# Altium footprint library UltraZOhm_CarrierBoard.PcbLib: 71 footprints (part 5 of 5)
Each footprint in its own frame and in the unit in brackets; x right, y up, seen from the top. Pads: shape width x height; smd on the part's side, far side on the other; paste and mask are expansions set on the pad; w line width, h text height; cw(c..) or ccw(c..) is an arc to the next point about the centre after c.
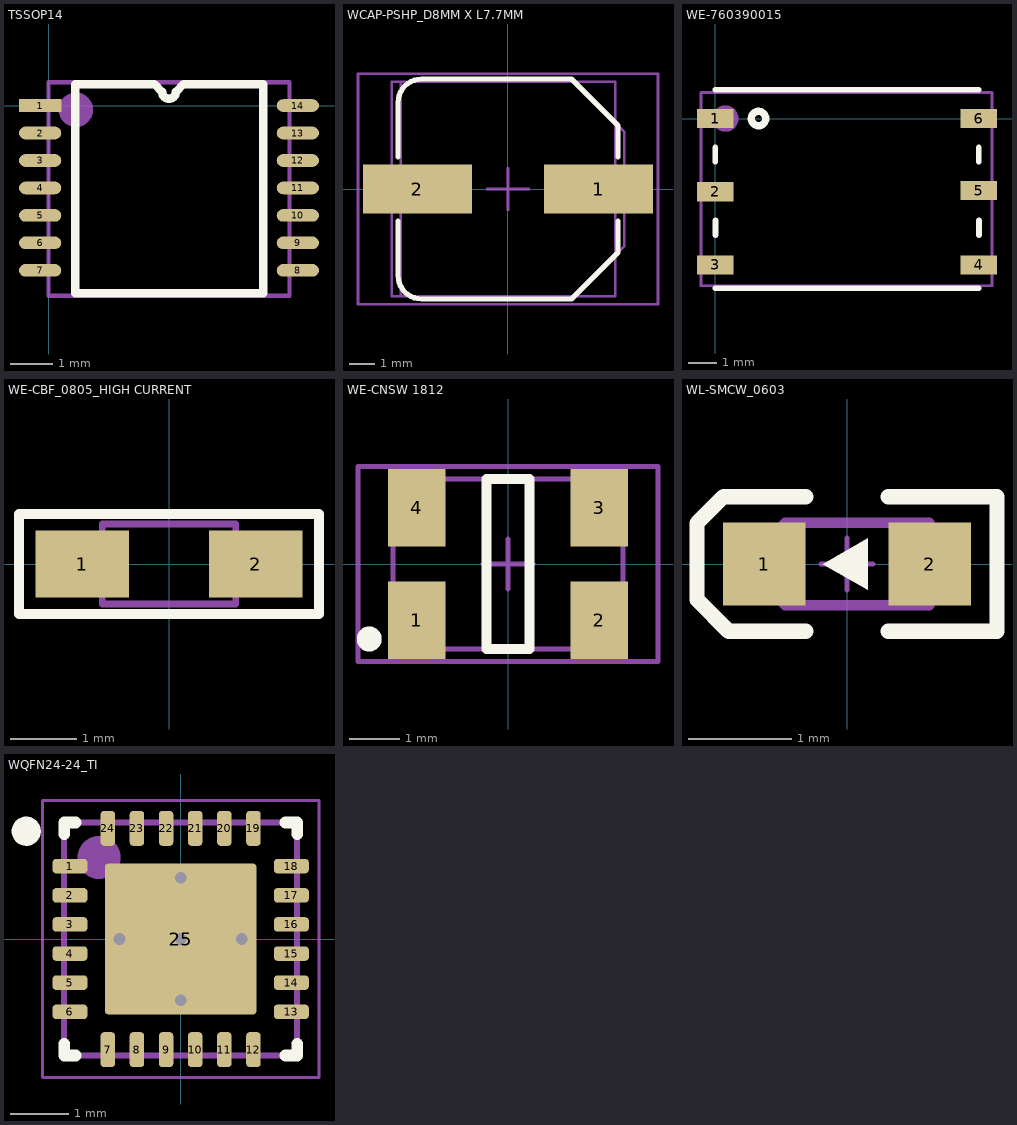
[diagram p4: the footprints below, top view; thin cyan lines are the x and y axes]

## TSSOP14 [mm]
pads (14):
  rect 1x0.3 smd: 1(-0.2,0)
  oval 1x0.3 smd: 2(-0.2,-0.65) 3(-0.2,-1.3) 4(-0.2,-1.95) 5(-0.2,-2.6) 6(-0.2,-3.25) 7(-0.2,-3.9) 8(5.9,-3.9) 9(5.9,-3.25) 10(5.9,-2.6) 11(5.9,-1.95) 12(5.9,-1.3) 13(5.9,-0.65) 14(5.9,0)
Top Overlay:
  lines w0.2: 0.635,-4.445 0.635,0.508 2.505,0.508 2.688,0.325 ccw(c2.85,0.325) 3.012,0.325 3.195,0.508 5.08,0.508 5.08,-4.445 0.635,-4.445
Mechanical 5:
  circle w0.406: c0.646,-0.1 r0.203
  lines w0.1: 0,-4.5 5.7,-4.5 5.7,0.55 0,0.55 0,-4.5
  text ".Designator" at 1.653,-2.554 h0.76
3D body: height 1.1, standoff 0.15, extent 0.635,-4.5 5.08,0.6
3D body "User Library-tssop14-2.STEP": height 1.2, standoff 0, extent -0.343,-4.5 6.057,0.6

## WCAP-PSHP_D8MM X L7.7MM [mm]
pads (2):
  rect 4.2x1.9 smd: 1(3.5,0) 2(-3.5,0)
Top Overlay:
  lines w0.2: -4.25,-1.25 -4.25,-3.35 ccw(c-3.35,-3.35) -3.35,-4.25 2.45,-4.25 4.25,-2.45 4.25,-1.25 ; -4.25,1.25 -4.25,3.35 cw(c-3.35,3.35) -3.35,4.25 2.45,4.25 4.25,2.45 4.25,1.25
Mechanical 5:
  lines w0.1: -4.5,-4.15 2.55,-4.15 4.5,-2.2 4.5,2.2 2.55,4.15 -4.5,4.15 -4.5,-4.15
  text ".Designator" at -2.4,-0.8 h1.52
Mechanical 11:
  lines w0.1: -4.15,-4.15 -4.15,4.15 4.15,4.15 4.15,-4.15 -4.15,-4.15
Mechanical 15:
  lines w0.1: -0.8,0 0.8,0 ; 0,-0.8 0,0.8 ; -5.8,-4.45 5.8,-4.45 5.8,4.45 -5.8,4.45 -5.8,-4.45
3D body "8x7.7x3.1.stp": height 7.67, standoff -0.03, extent -4.5,-4.15 4.5,4.15

## WE-760390015 [mm]
pads (6):
  rect 1.27x0.66 smd: 1(0,0) 2(0,-2.54) 3(0,-5.08) 4(9.14,-5.08) 5(9.14,-2.5) 6(9.14,0)
Top Overlay:
  circle w0.254: c1.5,0 r0.25
  lines w0.2: 0,-5.889 9.14,-5.889 ; 0,-1.5 0,-1 ; 0,1 9.14,1 ; 0.008,-4.04 0.008,-3.54 ; 9.14,-1.5 9.14,-1 ; 9.152,-4.04 9.152,-3.54
Mechanical 5:
  circle w0.457: c0.35,0 r0.229
  lines w0.1: -0.5,-5.8 -0.5,0.9 9.6,0.9 9.6,-5.8 -0.5,-5.8
  text ".Designator" at 5.008,-4.535 h1.52
3D body "250-1109 (rev1).STEP": height 4.19, standoff 0, extent -0.464,-5.822 9.586,0.908

## WE-CBF_0805_HIGH CURRENT [mm]
pads (2):
  rect 1.4x1 smd: 1(-1.3,0) 2(1.3,0)
Top Overlay:
  lines w0.15: -2.25,-0.75 -2.25,0.75 2.25,0.75 2.25,-0.75 -2.25,-0.75
Mechanical 5:
  lines w0.1: -1,-0.6 1,-0.6 1,0.6 -1,0.6 -1,-0.6
  text ".Designator" at 0.576,0.39 h0.76
Mechanical 15:
  lines w0.1: -1,-0.6 -1,0.6 1,0.6 1,-0.6 -1,-0.6
3D body "WE-CBF_0805_CBF.stp": height 0.93, standoff 0.03, extent -1,-0.6 1,0.6

## WE-CNSW 1812 [mm]
pads (4):
  rect 1.15x1.55 smd: 1(-1.825,-1.125) 2(1.825,-1.125) 3(1.825,1.125) 4(-1.825,1.125)
Top Overlay:
  circle w0.25: c-2.775,-1.5 r0.125
  lines w0.2: -0.425,-1.7 0.425,-1.7 0.425,1.7 -0.425,1.7 -0.425,-1.7
Mechanical 5:
  lines w0.1: -2.3,-1.7 2.3,-1.7 2.3,1.7 -2.3,1.7 -2.3,-1.7
  lines w0.381: -1.703,-1.243 cw(c-1.829,-1.235) -1.703,-1.222
  text ".Designator" at -1.097,-0.254 h0.76
Mechanical 15:
  lines w0.1: -0.5,0 0.5,0 ; 0,-0.5 0,0.5 ; -3,-1.95 3,-1.95 3,1.95 -3,1.95 -3,-1.95
3D body "WE-CNSW_1812_CNSW.stp": height 2.8, standoff -0.05, extent -2.25,-1.6 2.25,1.6

## WL-SMCW_0603 [mm]
pads (2):
  rect 0.8x0.8 smd: 1(-0.8,0) 2(0.8,0)
Top Overlay:
  region: -0.233,0 0.2,-0.25 0.2,0.25
  lines w0.15: -0.4,-0.654 -1.146,-0.654 -1.454,-0.346 -1.454,0.396 -1.196,0.654 -0.4,0.654 ; 0.4,-0.654 1.454,-0.654 1.454,0.654 0.4,0.654
Mechanical 5:
  lines w0.1: -0.8,-0.2 -0.6,-0.4 0.8,-0.4 0.8,0.4 -0.6,0.4 -0.8,0.2 -0.8,-0.2
  text ".Designator" at 0.947,-0.648 h0.76
Mechanical 15:
  lines w0.05: -0.25,0 0.25,0 ; 0,-0.25 0,0.25
3D body "WL-SMCW_0603_LED.stp": height 0.7, standoff 0, extent -0.8,-0.4 0.8,0.4

## WQFN24-24_TI [mm]
pads (25):
  rrect50% 0.6x0.25 smd: 1(-1.9,1.25) 2(-1.9,0.75) 3(-1.9,0.25) 4(-1.9,-0.25) 5(-1.9,-0.75) 6(-1.9,-1.25) 13(1.9,-1.25) 14(1.9,-0.75) 15(1.9,-0.25) 16(1.9,0.25) 17(1.9,0.75) 18(1.9,1.25)
  rrect50% 0.25x0.6 smd: 7(-1.25,-1.9) 8(-0.75,-1.9) 9(-0.25,-1.9) 10(0.25,-1.9) 11(0.75,-1.9) 12(1.25,-1.9) 19(1.25,1.9) 20(0.75,1.9) 21(0.25,1.9) 22(-0.25,1.9) 23(-0.75,1.9) 24(-1.25,1.9)
  rrect5% 2.6x2.6 smd: 25(0,0)
via 0,0 diameter 0.4 hole 0.2
via 0,-1.05 diameter 0.4 hole 0.2
via -1.05,0 diameter 0.4 hole 0.2
via 1.05,0 diameter 0.4 hole 0.2
via 0,1.05 diameter 0.4 hole 0.2
Top Overlay:
  circle w0.25: c-2.65,1.85 r0.125
  lines w0.2: -2,-1.8 -2,-2 -1.8,-2 ; -2,1.8 -2,2 -1.8,2 ; 1.8,-2 2,-2 2,-1.8 ; 1.8,2 2,2 2,1.8
Mechanical 5:
  circle w0.381: c-1.4,1.4 r0.178
  lines w0.1: -2,-2 2,-2 2,2 -2,2 -2,-2
  text ".Designator" at 1.632,0.497 h1.27
Mechanical 15:
  lines w0.05: -2.375,-2.375 2.375,-2.375 2.375,2.375 -2.375,2.375 -2.375,-2.375
  lines w0.1: -0.5,0 0.5,0 ; 0,-0.5 0,0.5
3D body: height 0.8, standoff 0, extent -2,-2 2,2